# Altium footprint library DrPCB.PcbLib: 910 footprints (part 50 of 57)
Each footprint in its own frame and in the unit in brackets; x right, y up, seen from the top. Pads: shape width x height; smd on the part's side, far side on the other; paste and mask are expansions set on the pad; w line width, h text height; cw(c..) or ccw(c..) is an arc to the next point about the centre after c.
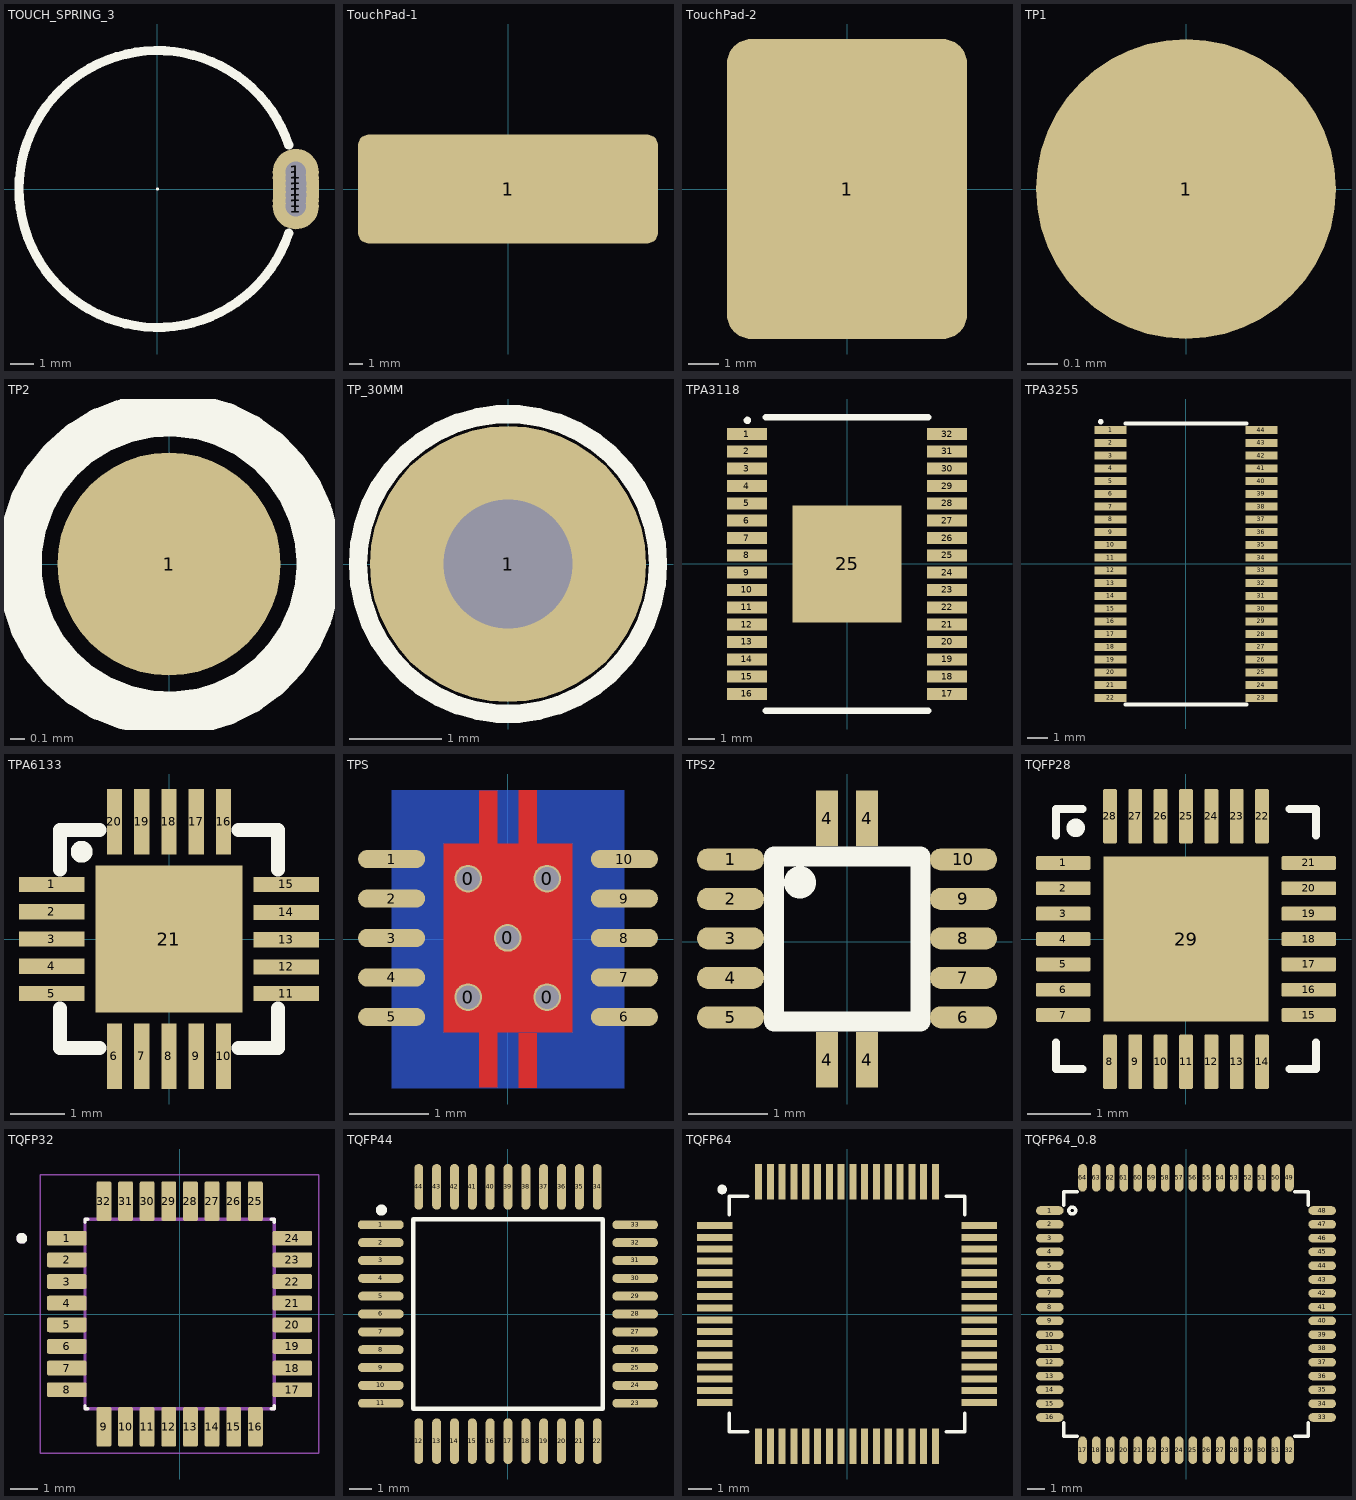
[diagram p49: the footprints below, top view; thin cyan lines are the x and y axes]

## TOUCH_SPRING_3 [mm]
pads (7):
  round 2 hole 0.9: 1(5.994,-0.749) 1(5.994,-0.508) 1(5.994,0.483) 1(5.994,0.737) 1(6,-0.257) 1(6,0) 1(6,0.243)
Top Overlay:
  circle w0.1: c0,0 r0.018
  lines w0.4: 5.687,-1.913 cw(c0,0) 5.691,1.901
3D body "User Library-spring-7.step": height 12.6, standoff 0.1, extent -6.1,-6.1 6.1,6.1

## TouchPad-1 [mm]
pads (1):
  rrect20% 22x8 smd: 1(0,0)

## TouchPad-2 [mm]
pads (1):
  rrect20% 8x10 smd: 1(0,0)

## TP1 [mm]
pads (1):
  round 1 smd mask+0: 1(0,0)

## TP2 [mm]
pads (1):
  round 1.5 smd paste-1 mask+0: 1(0,0)
Top Overlay:
  circle w0.3: c0,0 r1.008

## TP_30MM [mm]
pads (1):
  round 3 hole 1.4: 1(0,0)
Top Overlay:
  circle w0.2: c0,0 r1.628
3D body: height 23, standoff -7, extent -0.632,-0.634 0.633,0.634

## TPA3118 [mm]
pads (33):
  rect 1.5x0.45 smd: 1(-3.75,4.875) 2(-3.75,4.225) 3(-3.75,3.575) 4(-3.75,2.925) 5(-3.75,2.275) 6(-3.75,1.625) 7(-3.75,0.975) 8(-3.75,0.325) 9(-3.75,-0.325) 10(-3.75,-0.975) 11(-3.75,-1.625) 12(-3.75,-2.275) 13(-3.75,-2.925) 14(-3.75,-3.575) 15(-3.75,-4.225) 16(-3.75,-4.875) 17(3.75,-4.875) 18(3.75,-4.225) 19(3.75,-3.575) 20(3.75,-2.925) 21(3.75,-2.275) 22(3.75,-1.625) 23(3.75,-0.975) 24(3.75,-0.325) 25(3.75,0.325) 26(3.75,0.975) 27(3.75,1.625) 28(3.75,2.275) 29(3.75,2.925) 30(3.75,3.575) 31(3.75,4.225) 32(3.75,4.875)
  rect 4.1x4.4 smd: 25(0,0)
Top Overlay:
  circle w0.254: c-3.734,5.385 r0.013
  lines w0.254: -3.05,-5.5 3.05,-5.5 ; -3.05,5.5 3.05,5.5

## TPA3255 [mm]
pads (44):
  rect 1.6x0.4 smd: 1(-3.75,6.667) 2(-3.75,6.032) 3(-3.75,5.397) 4(-3.75,4.762) 5(-3.75,4.127) 6(-3.75,3.492) 7(-3.75,2.857) 8(-3.75,2.222) 9(-3.75,1.587) 10(-3.75,0.952) 11(-3.75,0.317) 12(-3.75,-0.318) 13(-3.75,-0.953) 14(-3.75,-1.588) 15(-3.75,-2.223) 16(-3.75,-2.858) 17(-3.75,-3.493) 18(-3.75,-4.128) 19(-3.75,-4.763) 20(-3.75,-5.398) 21(-3.75,-6.033) 22(-3.75,-6.668) 23(3.75,-6.668) 24(3.75,-6.033) 25(3.75,-5.398) 26(3.75,-4.763) 27(3.75,-4.128) 28(3.75,-3.493) 29(3.75,-2.858) 30(3.75,-2.223) 31(3.75,-1.588) 32(3.75,-0.953) 33(3.75,-0.318) 34(3.75,0.317) 35(3.75,0.952) 36(3.75,1.587) 37(3.75,2.222) 38(3.75,2.857) 39(3.75,3.492) 40(3.75,4.127) 41(3.75,4.762) 42(3.75,5.397) 43(3.75,6.032) 44(3.75,6.667)
Top Overlay:
  circle w0.254: c-4.242,7.087 r0.013
  lines w0.2: -3,-7 3,-7 ; -3,7 3,7

## TPA6133 [mm]
pads (21):
  rect 1.2x0.28 smd: 1(-2.15,1) 2(-2.15,0.5) 3(-2.15,0) 4(-2.15,-0.5) 5(-2.15,-1) 11(2.15,-1) 12(2.15,-0.513) 13(2.15,-0.013) 14(2.15,0.487) 15(2.15,1)
  rect 0.28x1.2 smd: 6(-1,-2.15) 7(-0.5,-2.15) 8(0,-2.15) 9(0.5,-2.15) 10(1,-2.15) 16(1,2.15) 17(0.5,2.15) 18(0,2.15) 19(-0.5,2.15) 20(-1,2.15)
  rect 2.7x2.7 smd: 21(0,0)
Top Overlay:
  circle w0.254: c-1.6,1.6 r0.074
  lines w0.254: -2,-1.27 -2,-2 -1.27,-2 ; -2,1.27 -2,2 -1.27,2 ; 1.27,-2 2,-2 2,-1.27 ; 1.27,2 2,2 2,1.27

## TPS [mm]
pads (15):
  round 0.35 hole 0.3: 0(-0.498,-0.734) 0(-0.498,0.766) 0(0.002,0.016) 0(0.502,-0.734) 0(0.502,0.766)
  oval 0.85x0.23 smd: 1(-1.469,1.015) 2(-1.469,0.515) 3(-1.469,0.015) 4(-1.469,-0.485) 5(-1.469,-0.985) 6(1.481,-0.985) 7(1.481,-0.485) 8(1.481,0.015) 9(1.481,0.515) 10(1.481,1.015)
Top Layer:
  region: 0.821,-1.185 0.821,1.215 -0.809,1.215 -0.809,-1.185
  region: -0.129,-1.881 -0.129,-1.181 -0.359,-1.181 -0.359,-1.881
  region: 0.371,-1.886 0.371,-1.186 0.141,-1.186 0.141,-1.886
  region: 0.371,1.191 0.371,1.891 0.141,1.891 0.141,1.191
  region: -0.129,1.185 -0.129,1.885 -0.359,1.885 -0.359,1.185
Bottom Layer:
  region: 1.481,-1.889 1.481,1.888 -1.469,1.888 -1.469,-1.889

## TPS2 [mm]
pads (14):
  oval 0.85x0.28 smd: 1(-1.477,1.039) 2(-1.477,0.539) 3(-1.477,0.039) 4(-1.477,-0.461) 5(-1.477,-0.961) 6(1.473,-0.961) 7(1.473,-0.461) 8(1.473,0.039) 9(1.473,0.539) 10(1.473,1.039)
  rect 0.28x0.7 smd: 4(-0.254,-1.499) 4(-0.254,1.562) 4(0.254,-1.499) 4(0.254,1.562)
Top Overlay:
  circle w0.254: c-0.598,0.749 r0.077
  lines w0.254: -0.927,-1.016 0.927,-1.016 0.927,1.079 -0.927,1.079 -0.927,-1.016

## TQFP28 [mm]
pads (29):
  rrect25% 0.86x0.22 smd: 1(-1.935,1.2) 2(-1.935,0.8) 3(-1.935,0.4) 4(-1.935,0) 5(-1.935,-0.4) 6(-1.935,-0.8) 7(-1.935,-1.2) 15(1.935,-1.2) 16(1.935,-0.8) 17(1.935,-0.4) 18(1.935,0) 19(1.935,0.4) 20(1.935,0.8) 21(1.935,1.2)
  rrect25% 0.22x0.86 smd: 8(-1.2,-1.935) 9(-0.8,-1.935) 10(-0.4,-1.935) 11(0,-1.935) 12(0.4,-1.935) 13(0.8,-1.935) 14(1.2,-1.935) 22(1.2,1.935) 23(0.8,1.935) 24(0.4,1.935) 25(0,1.935) 26(-0.4,1.935) 27(-0.8,1.935) 28(-1.2,1.935)
  rect 2.6x2.6 smd paste-2: 29(0,0)
Top Overlay:
  circle w0.254: c-1.74,1.753 r0.018
  lines w0.127: -2.05,-1.63 -2.05,-2.05 -1.63,-2.05 ; -2.05,1.63 -2.05,2.05 -1.63,2.05 ; 1.63,-2.05 2.05,-2.05 2.05,-1.63 ; 1.63,2.05 2.05,2.05 2.05,1.63
Top Paste:
  region: 0.82,-0.82 -0.82,-0.82 -0.82,0.82 0.82,0.82
3D body "MAX8903EETI+.STEP": height 0.8, standoff 0, extent -2,-2 2,2

## TQFP32 [mm]
height 1.2
pads (32):
  rrect25% 1.47x0.55 smd: 1(-4.17,2.8) 2(-4.17,2) 3(-4.17,1.2) 4(-4.17,0.4) 5(-4.17,-0.4) 6(-4.17,-1.2) 7(-4.17,-2) 8(-4.17,-2.8) 17(4.17,-2.8) 18(4.17,-2) 19(4.17,-1.2) 20(4.17,-0.4) 21(4.17,0.4) 22(4.17,1.2) 23(4.17,2) 24(4.17,2.8)
  rrect25% 0.55x1.47 smd: 9(-2.8,-4.17) 10(-2,-4.17) 11(-1.2,-4.17) 12(-0.4,-4.17) 13(0.4,-4.17) 14(1.2,-4.17) 15(2,-4.17) 16(2.8,-4.17) 25(2.8,4.17) 26(2,4.17) 27(1.2,4.17) 28(0.4,4.17) 29(-0.4,4.17) 30(-1.2,4.17) 31(-2,4.17) 32(-2.8,4.17)
Top Overlay:
  circle w0.2: c-5.84,2.8 r0.1
  lines w0.127: -3.5,-3.395 -3.5,-3.5 -3.395,-3.5 ; -3.5,3.395 -3.5,3.5 -3.395,3.5 ; 3.395,-3.5 3.5,-3.5 3.5,-3.395 ; 3.395,3.5 3.5,3.5 3.5,3.395
Mechanical 13:
  circle w0.2: c-5.84,2.8 r0.1
  lines w0.127: -3.5,-3.5 3.5,-3.5 3.5,3.5 -3.5,3.5 -3.5,-3.5
Mechanical 15:
  lines w0.05: -5.155,-5.155 5.155,-5.155 5.155,5.155 -5.155,5.155 -5.155,-5.155
3D body "step_temp.STEP": height 1.2, standoff 0, extent -4.5,-4.5 4.5,4.5

## TQFP44 [mm]
pads (44):
  oct 2.05x0.4 smd: 1(-5.687,4)
  oval 2.05x0.4 smd: 2(-5.687,3.2) 3(-5.687,2.4) 4(-5.687,1.6) 5(-5.687,0.8) 6(-5.687,0) 7(-5.687,-0.8) 8(-5.687,-1.6) 9(-5.687,-2.4) 10(-5.687,-3.2) 11(-5.687,-4) 23(5.713,-4) 24(5.713,-3.2) 25(5.713,-2.4) 26(5.713,-1.6) 27(5.713,-0.8) 28(5.713,0) 29(5.713,0.8) 30(5.713,1.6) 31(5.713,2.4) 32(5.713,3.2) 33(5.713,4)
  oval 0.4x2.05 smd: 12(-3.987,-5.7) 13(-3.187,-5.7) 14(-2.387,-5.7) 15(-1.587,-5.7) 16(-0.787,-5.7) 17(0.013,-5.7) 18(0.813,-5.7) 19(1.613,-5.7) 20(2.413,-5.7) 21(3.213,-5.7) 22(4.013,-5.7) 34(4.013,5.7) 35(3.213,5.7) 36(2.413,5.7) 37(1.613,5.7) 38(0.813,5.7) 39(0.013,5.7) 40(-0.787,5.7) 41(-1.587,5.7) 42(-2.387,5.7) 43(-3.187,5.7) 44(-3.987,5.7)
Top Overlay:
  circle w0.25: c-5.664,4.661 r0.125
  lines w0.2: -4.237,-4.25 4.263,-4.25 4.263,4.25 -4.237,4.25 -4.237,-4.25

## TQFP64 [mm]
pads (64):
  rect 1.5x0.3 smd: 1(-5.613,3.75) 2(-5.613,3.25) 3(-5.613,2.75) 4(-5.613,2.25) 5(-5.613,1.75) 6(-5.613,1.25) 7(-5.613,0.75) 8(-5.613,0.25) 9(-5.613,-0.25) 10(-5.613,-0.75) 11(-5.613,-1.25) 12(-5.613,-1.75) 13(-5.613,-2.25) 14(-5.613,-2.75) 15(-5.613,-3.25) 16(-5.613,-3.75) 33(5.613,-3.75) 34(5.613,-3.25) 35(5.613,-2.75) 36(5.613,-2.25) 37(5.613,-1.75) 38(5.613,-1.25) 39(5.613,-0.75) 40(5.613,-0.25) 41(5.613,0.25) 42(5.613,0.75) 43(5.613,1.25) 44(5.613,1.75) 45(5.613,2.25) 46(5.613,2.75) 47(5.613,3.25) 48(5.613,3.75)
  rect 0.3x1.5 smd: 17(-3.75,-5.613) 18(-3.25,-5.613) 19(-2.75,-5.613) 20(-2.25,-5.613) 21(-1.75,-5.613) 22(-1.25,-5.613) 23(-0.75,-5.613) 24(-0.25,-5.613) 25(0.25,-5.613) 26(0.75,-5.613) 27(1.25,-5.613) 28(1.75,-5.613) 29(2.25,-5.613) 30(2.75,-5.613) 31(3.25,-5.613) 32(3.75,-5.613) 49(3.75,5.613) 50(3.25,5.613) 51(2.75,5.613) 52(2.25,5.613) 53(1.75,5.613) 54(1.25,5.613) 55(0.75,5.613) 56(0.25,5.613) 57(-0.25,5.613) 58(-0.75,5.613) 59(-1.25,5.613) 60(-1.75,5.613) 61(-2.25,5.613) 62(-2.75,5.613) 63(-3.25,5.613) 64(-3.75,5.613)
Top Overlay:
  circle w0.254: c-5.296,5.283 r0.077
  lines w0.152: -5.004,-4.22 -5.004,-5.004 -4.22,-5.004 ; -5.004,4.22 -5.004,5.004 -4.22,5.004 ; 4.22,-5.004 5.004,-5.004 5.004,-4.22 ; 4.22,5.004 5.004,5.004 5.004,4.22
3D body "User Library-TQFP64_Grid_0_5.STEP": height 1.2, standoff 0, extent -6,-6 6,6

## TQFP64_0.8 [mm] "TQFP64, N65 (Cypress), , MS-026 AEB(JEDEC), 64A (atmel), 14X14mm, 0.8mm"
pads (64):
  oval 1.6x0.5 smd: 1(-7.9,6) 2(-7.9,5.2) 3(-7.9,4.4) 4(-7.9,3.6) 5(-7.9,2.8) 6(-7.9,2) 7(-7.9,1.2) 8(-7.9,0.4) 9(-7.9,-0.4) 10(-7.9,-1.2) 11(-7.9,-2) 12(-7.9,-2.8) 13(-7.9,-3.6) 14(-7.9,-4.4) 15(-7.9,-5.2) 16(-7.9,-6) 33(7.9,-6) 34(7.9,-5.2) 35(7.9,-4.4) 36(7.9,-3.6) 37(7.9,-2.8) 38(7.9,-2) 39(7.9,-1.2) 40(7.9,-0.4) 41(7.9,0.4) 42(7.9,1.2) 43(7.9,2) 44(7.9,2.8) 45(7.9,3.6) 46(7.9,4.4) 47(7.9,5.2) 48(7.9,6)
  oval 0.5x1.6 smd: 17(-6,-7.9) 18(-5.2,-7.9) 19(-4.4,-7.9) 20(-3.6,-7.9) 21(-2.8,-7.9) 22(-2,-7.9) 23(-1.2,-7.9) 24(-0.4,-7.9) 25(0.4,-7.9) 26(1.2,-7.9) 27(2,-7.9) 28(2.8,-7.9) 29(3.6,-7.9) 30(4.4,-7.9) 31(5.2,-7.9) 32(6,-7.9) 49(6,7.9) 50(5.2,7.9) 51(4.4,7.9) 52(3.6,7.9) 53(2.8,7.9) 54(2,7.9) 55(1.2,7.9) 56(0.4,7.9) 57(-0.4,7.9) 58(-1.2,7.9) 59(-2,7.9) 60(-2.8,7.9) 61(-3.6,7.9) 62(-4.4,7.9) 63(-5.2,7.9) 64(-6,7.9)
Top Overlay:
  circle w0.2: c-6.6,6 r0.2
  lines w0.2: -7.1,-6.3 -7.1,-7.1 -6.3,-7.1 ; -7.1,6.3 -7.1,7.1 -6.3,7.1 ; 6.3,-7.1 7.1,-7.1 7.1,-6.3 ; 6.3,7.1 7.1,7.1 7.1,6.3
3D body "User Library-atmega64 (tqfp64).step": height 1.1, standoff -0.01, extent -8,-8 8,8